# Altium footprint library hphonglib.PcbLib: 703 footprints (part 27 of 44)
Each footprint in its own frame and in the unit in brackets; x right, y up, seen from the top. Pads: shape width x height; smd on the part's side, far side on the other; paste and mask are expansions set on the pad; w line width, h text height; cw(c..) or ccw(c..) is an arc to the next point about the centre after c.
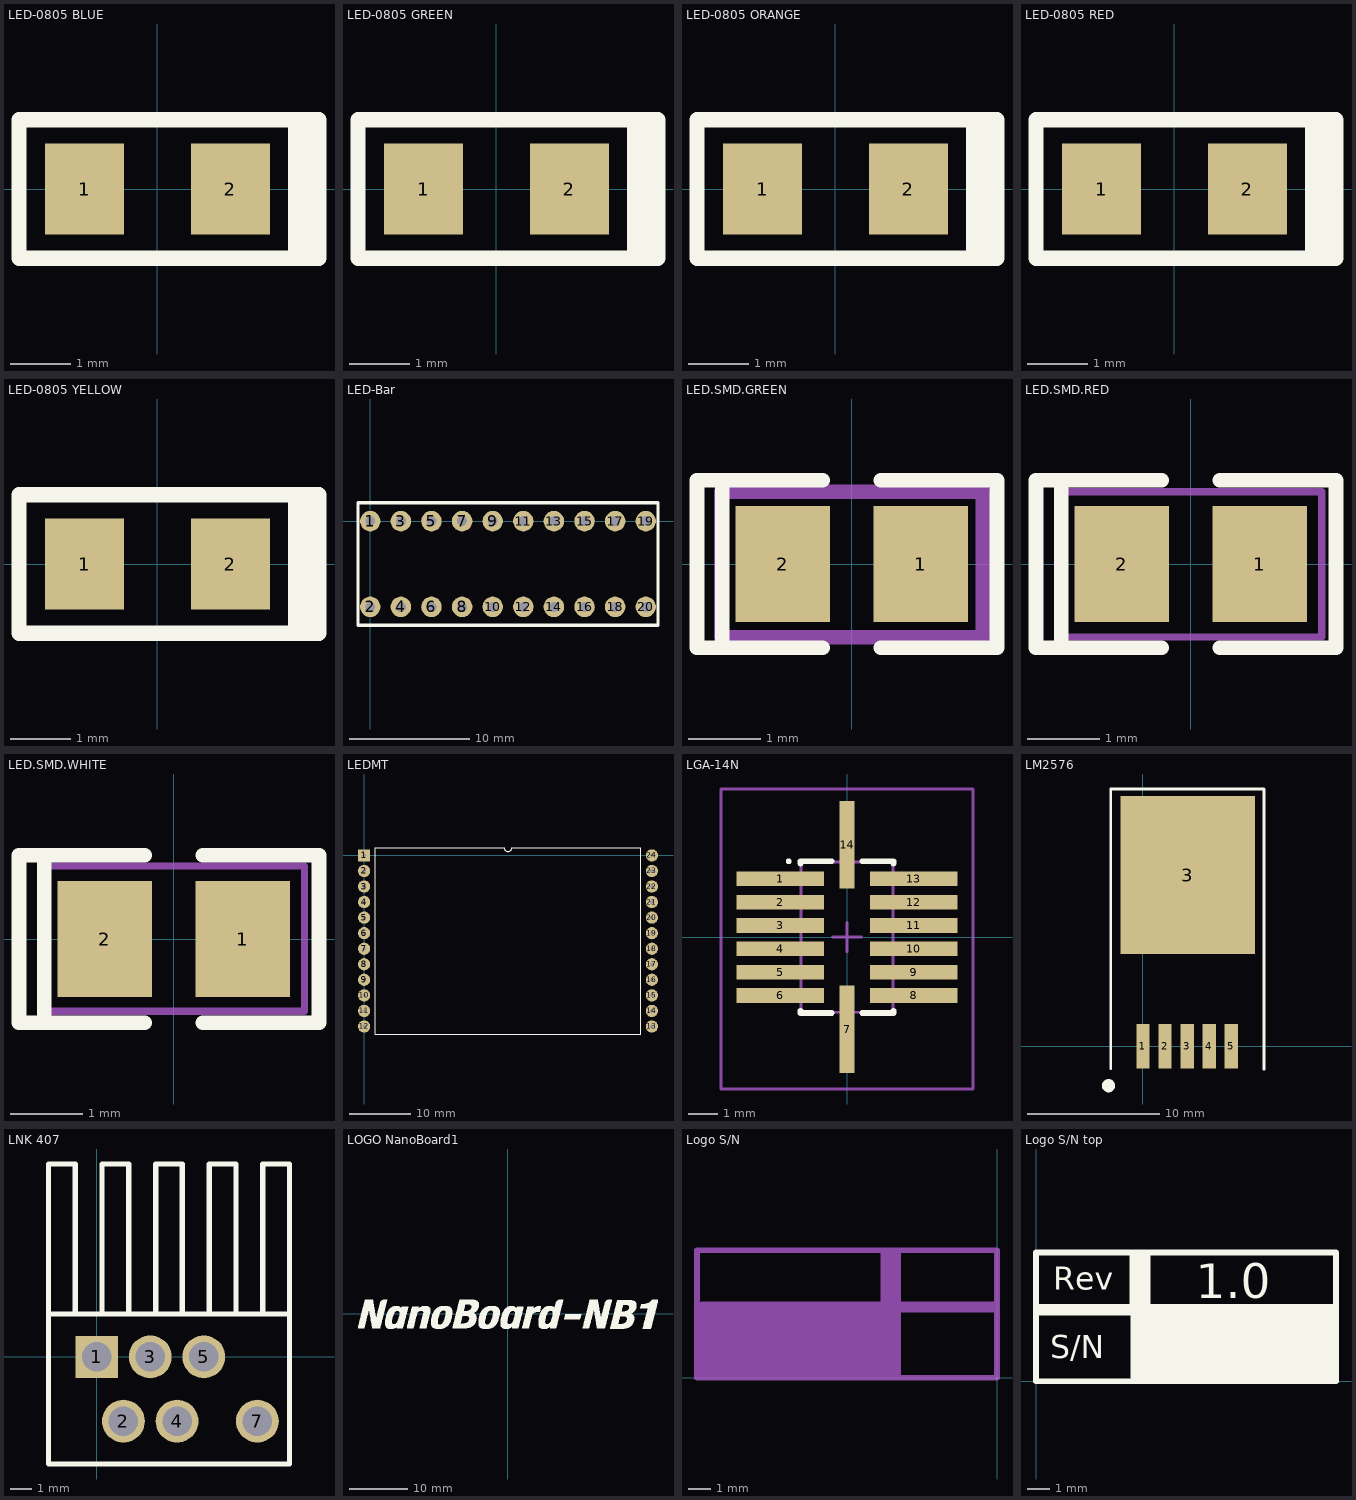
[diagram p26: the footprints below, top view; thin cyan lines are the x and y axes]

## LED-0805 BLUE [mm] "Chip LED; BLUE; Body 2.0 x 1.3 mm (LxW typ) [2012]"
height 0.65
pads (2):
  rect 1.3x1.5 smd: 1(-1.204,0) 2(1.204,0)
Top Overlay:
  lines w0.254: 2.286,-1.143 2.286,1.143 ; 2.413,-1.143 2.413,1.143 ; 2.54,-1.143 2.54,1.143 ; -2.286,-1.143 2.667,-1.143 2.667,1.143 -2.286,1.143 -2.286,-1.143
3D body: height 1.1, standoff 0, extent -1.006,-0.628 1.014,0.622

## LED-0805 GREEN [mm] "Chip LED; GREEN; Body 2.0 x 1.3 mm (LxW typ) [2012]"
height 0.65
pads (2):
  rect 1.3x1.5 smd: 1(-1.204,0) 2(1.204,0)
Top Overlay:
  lines w0.254: 2.286,-1.143 2.286,1.143 ; 2.413,-1.143 2.413,1.143 ; 2.54,-1.143 2.54,1.143 ; -2.286,-1.143 -2.286,1.143 2.667,1.143 2.667,-1.143 -2.286,-1.143
3D body: height 1.1, standoff 0, extent -1.006,-0.628 1.014,0.622

## LED-0805 ORANGE [mm] "Chip LED; ORANGE; Body 2.0 x 1.3 mm (LxW typ) [2012]"
height 0.65
pads (2):
  rect 1.3x1.5 smd: 1(-1.204,0) 2(1.204,0)
Top Overlay:
  lines w0.254: 2.286,-1.143 2.286,1.143 ; 2.413,-1.143 2.413,1.143 ; 2.54,-1.143 2.54,1.143 ; -2.286,-1.143 -2.286,1.143 2.667,1.143 2.667,-1.143 -2.286,-1.143
3D body: height 1.1, standoff 0, extent -1.006,-0.628 1.014,0.622

## LED-0805 RED [mm] "Chip LED; RED; Body 2.0 x 1.3 mm (LxW typ) [2012]"
height 0.65
pads (2):
  rect 1.3x1.5 smd: 1(-1.204,0) 2(1.204,0)
Top Overlay:
  lines w0.254: 2.286,-1.143 2.286,1.143 ; 2.413,-1.143 2.413,1.143 ; 2.54,-1.143 2.54,1.143 ; -2.286,-1.143 -2.286,1.143 2.667,1.143 2.667,-1.143 -2.286,-1.143
3D body: height 1.1, standoff 0, extent -1.006,-0.628 1.014,0.622

## LED-0805 YELLOW [mm] "Chip LED; YELLOW; Body 2.0 x 1.3 mm (LxW typ) [2012]"
height 0.65
pads (2):
  rect 1.3x1.5 smd: 1(-1.204,0) 2(1.204,0)
Top Overlay:
  lines w0.254: 2.286,-1.143 2.286,1.143 ; 2.413,-1.143 2.413,1.143 ; 2.54,-1.143 2.54,1.143 ; -2.286,-1.143 -2.286,1.143 2.667,1.143 2.667,-1.143 -2.286,-1.143
3D body: height 1.1, standoff 0, extent -1.006,-0.628 1.014,0.622

## LED-Bar [mil] "LED Bar; 10 Indicator; Solder Pad 35mil"
pads (20):
  round 67 hole 32: 1(0,0) 2(0,-280) 3(100,0) 4(100,-280) 5(200,0) 6(200,-280) 7(300,0) 8(300,-280) 9(400,0) 10(400,-280) 11(500,0) 12(500,-280) 13(600,0) 14(600,-280) 15(700,0) 16(700,-280) 17(800,0) 18(800,-280) 19(900,0) 20(900,-280)
Top Overlay:
  lines w10: -40,-340 -40,60 940,60 940,-340 -40,-340

## LED.SMD.GREEN [mm]
pads (2):
  rect 1.3x1.6 smd: 1(0.948,0.006) 2(-0.952,0.006)
Top Overlay:
  lines w0.2: -1.782,-1.144 -1.782,1.156 ; -0.402,-1.144 -2.132,-1.144 -2.132,1.156 -0.402,1.156 ; 0.398,-1.144 1.998,-1.144 1.998,1.156 0.398,1.156
Mechanical 13:
  lines w0.2: -1.8,-1 -1.8,1 1.8,1 1.8,-1 -1.8,-1
3D body: height 1.14, standoff 0.61, extent -0.699,-0.635 0.699,0.635
3D body: height 0.61, standoff 0, extent -1.079,-0.635 1.079,0.635

## LED.SMD.RED [mm]
pads (2):
  rect 1.3x1.6 smd: 1(0.948,0.006) 2(-0.952,0.006)
Top Overlay:
  lines w0.2: -1.782,-1.144 -1.782,1.156 ; -0.402,-1.144 -2.132,-1.144 -2.132,1.156 -0.402,1.156 ; 0.398,-1.144 1.998,-1.144 1.998,1.156 0.398,1.156
Mechanical 13:
  lines w0.1: -1.8,-1 -1.8,1 1.8,1 1.8,-1 -1.8,-1
3D body: height 1.14, standoff 0.61, extent -0.699,-0.635 0.699,0.635
3D body: height 0.61, standoff 0, extent -1.079,-0.635 1.079,0.635

## LED.SMD.WHITE [mm]
pads (2):
  rect 1.3x1.6 smd: 1(0.948,0.006) 2(-0.952,0.006)
Top Overlay:
  lines w0.2: -1.782,-1.144 -1.782,1.156 ; -0.402,-1.144 -2.132,-1.144 -2.132,1.156 -0.402,1.156 ; 0.398,-1.144 1.998,-1.144 1.998,1.156 0.398,1.156
Mechanical 13:
  lines w0.1: -1.803,-0.991 -1.803,1.009 1.797,1.009 1.797,-0.991 -1.803,-0.991
3D body: height 1.14, standoff 0.61, extent -0.699,-0.635 0.699,0.635
3D body: height 0.61, standoff 0, extent -1.079,-0.635 1.079,0.635

## LEDMT [mm] "led matrix 8x8 dual color"
pads (24):
  rect 2x2 hole 0.6: 1(0,0)
  round 2 hole 0.6: 2(0,-2.54) 3(0,-5.08) 4(0,-7.62) 5(0,-10.16) 6(0,-12.7) 7(0,-15.24) 8(0,-17.78) 9(0,-20.32) 10(0,-22.86) 11(0,-25.4) 12(0,-27.94) 13(47,-27.94) 14(47,-25.4) 15(47,-22.86) 16(47,-20.32) 17(47,-17.78) 18(47,-15.24) 19(47,-12.7) 20(47,-10.16) 21(47,-7.62) 22(47,-5.08) 23(47,-2.54) 24(47,0)
Top Overlay:
  lines w0.2: 1.835,-29.21 45.165,-29.21 45.165,1.27 24.135,1.27 cw(c23.5,1.27) 22.865,1.27 1.835,1.27 1.835,-29.21

## LGA-14N [mm] "LGA, 14-Leads, Body 3x5x0.92mm, Pitch 0.8mm, IPC Medium Density"
height 1
pads (14):
  rect 3x0.5 smd: 1(-2.291,2) 2(-2.291,1.2) 3(-2.291,0.4) 4(-2.291,-0.4) 5(-2.291,-1.2) 6(-2.291,-2) 8(2.291,-2) 9(2.291,-1.2) 10(2.291,-0.4) 11(2.291,0.4) 12(2.291,1.2) 13(2.291,2)
  rect 0.5x3 smd: 7(0,-3.164) 14(0,3.164)
Top Overlay:
  circle w0.1: c-2,2.6 r0.05
  lines w0.2: -1.6,-2.525 -1.6,-2.6 -0.525,-2.6 ; -1.6,2.525 -1.6,2.6 -0.525,2.6 ; 0.525,-2.6 1.6,-2.6 1.6,-2.525 ; 0.525,2.6 1.6,2.6 1.6,2.525
Mechanical 13:
  lines w0.1: -1.575,-2.575 -1.575,2.575 1.575,2.575 1.575,-2.575 -1.575,-2.575
Mechanical 15:
  lines w0.1: -0.5,0 0.5,0 ; 0,-0.5 0,0.5 ; -4.318,-5.207 -4.318,5.08 4.318,5.08 4.318,-5.207 -4.318,-5.207
3D body: height 1.03, standoff -0.4, extent -1.499,-2.5 1.501,2.5

## LM2576 [mm]
pads (6):
  rect 1x3.4 smd: 1(0,0) 2(1.68,0)
  rect 1.016x3.4 smd: 3(3.36,0) 4(5.04,0) 5(6.72,0)
  rect 10.25x12 smd mask+0.102: 3(3.404,13)
Top Overlay:
  circle w0.5: c-2.612,-2.997 r0.25
  lines w0.2: -2.438,-1.702 -2.438,19.533 9.195,19.533 9.195,12.968 9.195,-1.753
3D body: height 4.75, standoff -0.05, extent -1.647,-1.118 8.353,14.552

## LNK 407 [mil] "Led lighting controller"
pads (6):
  rect 78.74x78.74 hole 55: 1(0,0)
  round 80 hole 55: 2(50,-120) 3(100,0) 4(150,-120) 5(200,0) 7(300,-120)
Top Overlay:
  lines w10: -40,80 -40,360 -90,360 -90,80 ; 10,80 10,360 60,360 60,80 ; 110,80 110,360 160,360 160,80 ; 210,80 210,360 260,360 260,80 ; 310,80 310,360 360,360 360,80 ; -90,80 360,80 ; -90,80 -90,-200 360,-200 360,80

## LOGO NanoBoard1 [mm] "NanoBoard Logo"
Top Overlay:
  drawing of 3535 lines, arcs and shapes, not listed

## Logo S/N [mm] "Logo S/N"
Bottom Overlay:
  rectangle: -13.335,0 -4.318,3.073
  rectangle: -5.232,3.429 -4.318,5.715
  lines w0.254: -13.462,0 -13.462,5.715 0,5.715 0,0 -13.462,0
  lines w0.508: -13.208,3.175 -0.127,3.175
  text "1.1" at -6.985,3.683 h1.52
  text "Rev" at -0.889,3.81 h1.02
  text "S/N" at -0.889,1.016 h1.02

## Logo S/N top [mm]
Top Overlay:
  rectangle: 4.166,3.429 5.08,5.715
  rectangle: 4.191,0 13.208,3.073
  lines w0.254: 0,0 0,5.715 13.335,5.715 13.335,0 0,0
  lines w0.508: 0.127,3.175 13.208,3.175
  text "1.0" at 7.112,3.683 h1.52
  text "S/N" at 0.635,1.016 h1.02
  text "Rev" at 0.762,4.064 h1.02